# Altium footprint library Library.PcbLib: 308 footprints (part 21 of 21)
Each footprint in its own frame and in the unit in brackets; x right, y up, seen from the top. Pads: shape width x height; smd on the part's side, far side on the other; paste and mask are expansions set on the pad; w line width, h text height; cw(c..) or ccw(c..) is an arc to the next point about the centre after c.
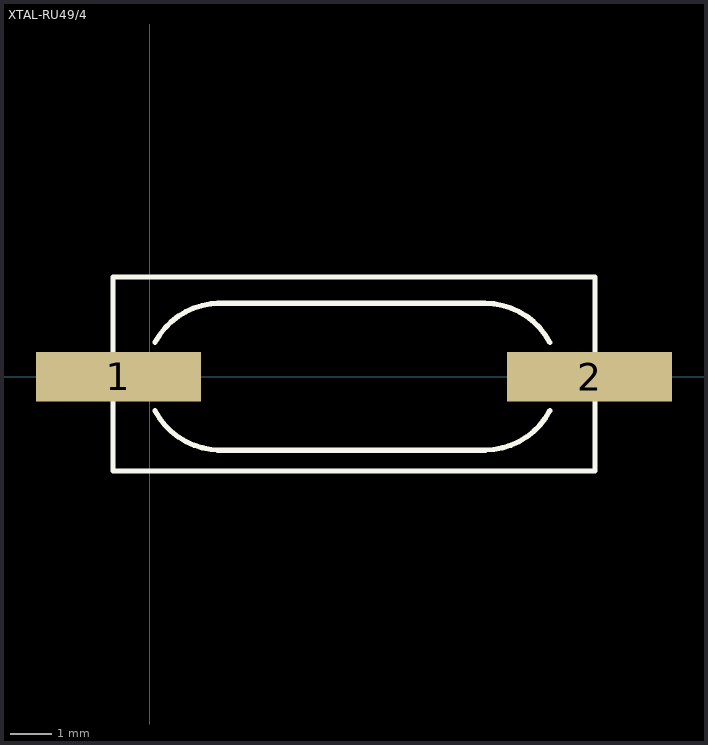
[diagram p20: the footprint, top view; thin cyan lines are the x and y axes]

## XTAL-RU49/4 [mm]
pads (2):
  rect 4x1.2 smd: 1(-0.762,0) 2(10.668,0)
Top Overlay:
  lines w0.127: 0.127,-0.825 ccw(c1.702,0) 1.702,-1.778 ; 0.127,0.825 cw(c1.702,0) 1.702,1.778 ; 1.651,-1.787 8.137,-1.787 ; 1.651,1.778 8.128,1.778 cw(c8.128,0) 9.703,0.825 ; 8.128,-1.778 ccw(c8.128,0) 9.703,-0.825 ; -0.889,-2.286 -0.889,2.413 10.795,2.413 10.795,-2.286 -0.889,-2.286
3D body "User Library-HC-49S.step": height 4.3, standoff -0.05, extent -1.197,-2.223 11.103,2.477